# Altium footprint library General_Lib.PcbLib: 729 footprints (part 6 of 46)
Each footprint in its own frame and in the unit in brackets; x right, y up, seen from the top. Pads: shape width x height; smd on the part's side, far side on the other; paste and mask are expansions set on the pad; w line width, h text height; cw(c..) or ccw(c..) is an arc to the next point about the centre after c.
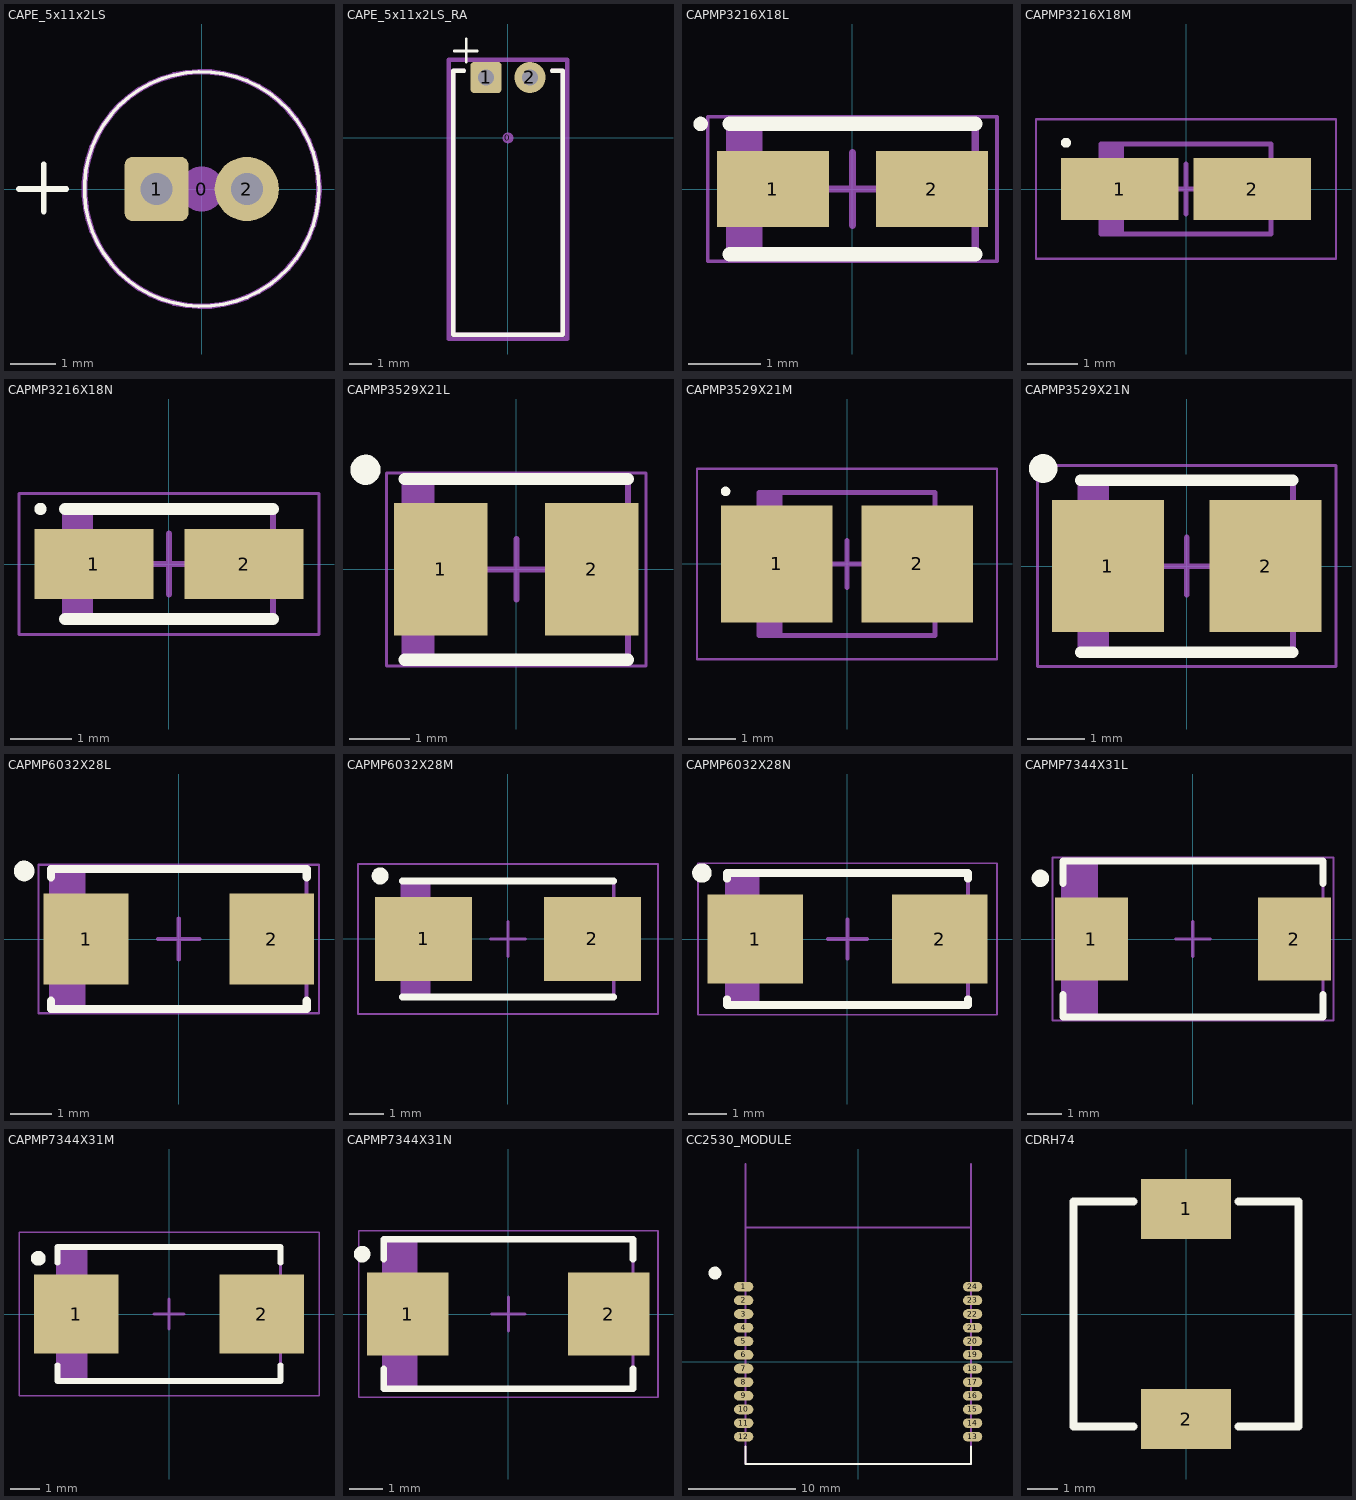
[diagram p5: the footprints below, top view; thin cyan lines are the x and y axes]

## CAPE_5x11x2LS [mil] "Capacitor, electrolytic, radial can"
height 433.07
pads (3):
  round 39.37 on Mech15: 0(0,0)
  rrect25% 56x56 hole 28: 1(-39.37,0)
  round 56 hole 28: 2(39.37,0)
Top Overlay:
  circle w3: c0,0 r102.36
  lines w5: -159.45,0 -118.11,0 ; -137.8,-19.68 -137.8,21.65
Mechanical 13:
  circle w5: c0,0 r102.36
3D body "Cap, elec, radial, 5x11x2LS.STEP": height 433.07, standoff -86.61, extent -98.42,-98.42 98.43,98.43

## CAPE_5x11x2LS_RA [mm] "Capacitor, electrolytic, radial can, laid over"
height 5
pads (3):
  round 0.5 on Mech15: 0(0,0)
  rrect25% 1.422x1.422 hole 0.711: 1(-1,2.75)
  round 1.422 hole 0.711: 2(1,2.75)
Top Overlay:
  lines w0.127: -2.45,3.95 -1.4,3.95 ; -1.9,3.45 -1.9,4.5
  lines w0.2: -2,3.05 -2.5,3.05 -2.5,-8.95 0,-8.95 2.5,-8.95 2.5,3.05 2,3.05
Mechanical 13:
  lines w0.2: -2,3.05 -2.5,3.05 -2.5,-8.95 0,-8.95 2.5,-8.95 2.5,3.05 2,3.05
Mechanical 15:
  lines w0.2: -2.7,-9.15 2.7,-9.15 2.7,3.55 -2.7,3.55 -2.7,-9.15
3D body "Cap, elec, radial, 5x11x2LS, RA.STEP": height 5.1, standoff -2.2, extent -2.5,-8.947 2.5,3

## CAPMP3216X18L [mm] "Molded Capacitor, 2-Leads, Body 3,20x1,60mm, IPC High Density"
height 1.8
pads (2):
  rect 1.55x1.05 smd: 1(-1.1,0) 2(1.1,0)
Top Overlay:
  circle w0.1: c-2.1,0.9 r0.05
  lines w0.2: -1.7,-0.9 1.7,-0.9 ; -1.7,0.9 1.7,0.9
Mechanical 13:
  rectangle: -1.7,-0.9 -1.243,0.9
  lines w0.1: -1.7,-0.9 -1.7,0.9 1.7,0.9 1.7,-0.9 -1.7,-0.9
Mechanical 15:
  lines w0.05: -2,-1 -2,1 2,1 2,-1 -2,-1
  lines w0.1: -0.5,0 0.5,0 ; 0,-0.5 0,0.5
3D body "CAPMP3216X18L.step": height 1.8, standoff 0, extent -1.92,-0.9 1.92,0.9

## CAPMP3216X18M [mm] "Molded Capacitor, 2-Leads, Body 3,20x1,60mm, IPC Low Density"
height 1.8
pads (2):
  rect 2.35x1.25 smd: 1(-1.325,0) 2(1.325,0)
Top Overlay:
  circle w0.1: c-2.4,0.925 r0.05
Mechanical 13:
  rectangle: -1.7,-0.9 -1.243,0.9
  lines w0.1: -1.7,-0.9 -1.7,0.9 1.7,0.9 1.7,-0.9 -1.7,-0.9
Mechanical 15:
  lines w0.05: -3,-1.4 -3,1.4 3,1.4 3,-1.4 -3,-1.4
  lines w0.1: -0.5,0 0.5,0 ; 0,-0.5 0,0.5
3D body "CAPMP3216X18M.step": height 1.8, standoff 0, extent -1.92,-0.9 1.92,0.9

## CAPMP3216X18N [mm] "Molded Capacitor, 2-Leads, Body 3,20x1,60mm, IPC Medium Density"
height 1.8
pads (2):
  rect 1.95x1.15 smd: 1(-1.225,0) 2(1.225,0)
Top Overlay:
  circle w0.1: c-2.1,0.9 r0.05
  lines w0.2: -1.7,-0.9 1.7,-0.9 ; -1.7,0.9 1.7,0.9
Mechanical 13:
  rectangle: -1.7,-0.9 -1.243,0.9
  lines w0.1: -1.7,-0.9 -1.7,0.9 1.7,0.9 1.7,-0.9 -1.7,-0.9
Mechanical 15:
  lines w0.05: -2.45,-1.15 -2.45,1.15 2.45,1.15 2.45,-1.15 -2.45,-1.15
  lines w0.1: -0.5,0 0.5,0 ; 0,-0.5 0,0.5
3D body "CAPMP3216X18N.step": height 1.8, standoff 0, extent -1.92,-0.9 1.92,0.9

## CAPMP3529X21L [mm] "Molded Capacitor, 2-Leads, Body 3,50x2,85mm, IPC High Density"
height 2.1
pads (2):
  rect 1.55x2.2 smd: 1(-1.25,0) 2(1.25,0)
Top Overlay:
  circle w0.25: c-2.5,1.65 r0.125
  lines w0.2: -1.85,-1.5 1.85,-1.5 ; -1.85,1.5 1.85,1.5
Mechanical 13:
  rectangle: -1.85,-1.5 -1.352,1.5
  lines w0.1: -1.85,-1.5 1.85,-1.5 1.85,1.5 -1.85,1.5 -1.85,-1.5
Mechanical 15:
  lines w0.05: -2.15,-1.6 2.15,-1.6 2.15,1.6 -2.15,1.6 -2.15,-1.6
  lines w0.1: -0.5,0 0.5,0 ; 0,-0.5 0,0.5
3D body "CAPMP3529X21L.step": height 2.1, standoff 0, extent -2.07,-1.5 2.07,1.5

## CAPMP3529X21M [mm] "Molded Capacitor, 2-Leads, Body 3,50x2,85mm, IPC Low Density"
height 2.1
pads (2):
  rect 2.35x2.45 smd: 1(-1.475,0) 2(1.475,0)
Top Overlay:
  circle w0.1: c-2.55,1.525 r0.05
Mechanical 13:
  rectangle: -1.85,-1.5 -1.352,1.5
  lines w0.1: -1.85,-1.5 -1.85,1.5 1.85,1.5 1.85,-1.5 -1.85,-1.5
Mechanical 15:
  lines w0.05: -3.15,-2 -3.15,2 3.15,2 3.15,-2 -3.15,-2
  lines w0.1: -0.5,0 0.5,0 ; 0,-0.5 0,0.5
3D body "CAPMP3529X21M.step": height 2.1, standoff 0, extent -2.07,-1.5 2.07,1.5

## CAPMP3529X21N [mm] "Molded Capacitor, 2-Leads, Body 3,50x2,85mm, IPC Medium Density"
height 2.1
pads (2):
  rect 1.95x2.3 smd: 1(-1.375,0) 2(1.375,0)
Top Overlay:
  circle w0.25: c-2.5,1.7 r0.125
  lines w0.2: -1.85,-1.5 1.85,-1.5 ; -1.85,1.5 1.85,1.5
Mechanical 13:
  rectangle: -1.85,-1.5 -1.352,1.5
  lines w0.1: -1.85,-1.5 -1.85,1.5 1.85,1.5 1.85,-1.5 -1.85,-1.5
Mechanical 15:
  lines w0.05: -2.6,-1.75 -2.6,1.75 2.6,1.75 2.6,-1.75 -2.6,-1.75
  lines w0.1: -0.5,0 0.5,0 ; 0,-0.5 0,0.5
3D body "CAPMP3529X21N.step": height 2.1, standoff 0, extent -2.07,-1.5 2.07,1.5

## CAPMP6032X28L [mm] "Molded Capacitor, 2-Leads, Body 6,00x3,25mm, IPC High Density"
height 2.8
pads (2):
  rect 2.05x2.2 smd: 1(-2.25,0) 2(2.25,0)
Top Overlay:
  circle w0.25: c-3.75,1.65 r0.125
  lines w0.2: -3.1,-1.5 -3.1,-1.7 3.1,-1.7 3.1,-1.5 ; -3.1,1.5 -3.1,1.7 3.1,1.7 3.1,1.5
Mechanical 13:
  rectangle: -3.1,-1.7 -2.266,1.7
  lines w0.1: -3.1,-1.7 3.1,-1.7 3.1,1.7 -3.1,1.7 -3.1,-1.7
Mechanical 15:
  lines w0.05: -3.4,-1.8 3.4,-1.8 3.4,1.8 -3.4,1.8 -3.4,-1.8
  lines w0.1: -0.5,0 0.5,0 ; 0,-0.5 0,0.5
3D body "CAPMP6032X28L.step": height 2.8, standoff 0, extent -3.32,-1.7 3.32,1.7

## CAPMP6032X28M [mm] "Molded Capacitor, 2-Leads, Body 6,00x3,25mm, IPC Low Density"
height 2.8
pads (2):
  rect 2.85x2.45 smd: 1(-2.475,0) 2(2.475,0)
Top Overlay:
  circle w0.25: c-3.75,1.85 r0.125
  lines w0.2: -3.1,-1.7 3.1,-1.7 ; -3.1,1.7 3.1,1.7
Mechanical 13:
  rectangle: -3.1,-1.7 -2.266,1.7
  lines w0.1: -3.1,-1.7 3.1,-1.7 3.1,1.7 -3.1,1.7 -3.1,-1.7
Mechanical 15:
  lines w0.05: -4.4,-2.2 4.4,-2.2 4.4,2.2 -4.4,2.2 -4.4,-2.2
  lines w0.1: -0.5,0 0.5,0 ; 0,-0.5 0,0.5
3D body "CAPMP6032X28M.step": height 2.8, standoff 0, extent -3.32,-1.7 3.32,1.7

## CAPMP6032X28N [mm] "Molded Capacitor, 2-Leads, Body 6,00x3,25mm, IPC Medium Density"
height 2.8
pads (2):
  rect 2.45x2.3 smd: 1(-2.375,0) 2(2.375,0)
Top Overlay:
  circle w0.25: c-3.75,1.7 r0.125
  lines w0.2: -3.1,-1.55 -3.1,-1.7 3.1,-1.7 3.1,-1.55 ; -3.1,1.55 -3.1,1.7 3.1,1.7 3.1,1.55
Mechanical 13:
  rectangle: -3.1,-1.7 -2.266,1.7
  lines w0.1: -3.1,-1.7 3.1,-1.7 3.1,1.7 -3.1,1.7 -3.1,-1.7
Mechanical 15:
  lines w0.05: -3.85,-1.95 3.85,-1.95 3.85,1.95 -3.85,1.95 -3.85,-1.95
  lines w0.1: -0.5,0 0.5,0 ; 0,-0.5 0,0.5
3D body "CAPMP6032X28N.step": height 2.8, standoff 0, extent -3.32,-1.7 3.32,1.7

## CAPMP7344X31L [mm] "Molded Capacitor, 2-Leads, Body 7,30x4,35mm, IPC High Density"
height 3.1
pads (2):
  rect 2.1x2.4 smd: 1(-2.925,0) 2(2.925,0)
Top Overlay:
  circle w0.25: c-4.4,1.75 r0.125
  lines w0.2: -3.75,-1.6 -3.75,-2.25 3.75,-2.25 3.75,-1.6 ; -3.75,1.6 -3.75,2.25 3.75,2.25 3.75,1.6
Mechanical 13:
  rectangle: -3.75,-2.25 -2.741,2.25
  lines w0.1: -3.75,-2.25 3.75,-2.25 3.75,2.25 -3.75,2.25 -3.75,-2.25
Mechanical 15:
  lines w0.05: -4.05,-2.35 4.05,-2.35 4.05,2.35 -4.05,2.35 -4.05,-2.35
  lines w0.1: -0.5,0 0.5,0 ; 0,-0.5 0,0.5
3D body "CAPMP7344X31L.step": height 3.1, standoff 0, extent -3.97,-2.25 3.97,2.25

## CAPMP7344X31M [mm] "Molded Capacitor, 2-Leads, Body 7,30x4,35mm, IPC Low Density"
height 3.1
pads (2):
  rect 2.85x2.65 smd: 1(-3.125,0) 2(3.125,0)
Top Overlay:
  circle w0.25: c-4.4,1.875 r0.125
  lines w0.2: -3.75,-1.725 -3.75,-2.25 3.75,-2.25 3.75,-1.725 ; -3.75,1.725 -3.75,2.25 3.75,2.25 3.75,1.725
Mechanical 13:
  rectangle: -3.75,-2.25 -2.741,2.25
  lines w0.1: -3.75,-2.25 3.75,-2.25 3.75,2.25 -3.75,2.25 -3.75,-2.25
Mechanical 15:
  lines w0.05: -5.05,-2.75 5.05,-2.75 5.05,2.75 -5.05,2.75 -5.05,-2.75
  lines w0.1: -0.5,0 0.5,0 ; 0,-0.5 0,0.5
3D body "CAPMP7344X31M.step": height 3.1, standoff 0, extent -3.97,-2.25 3.97,2.25

## CAPMP7344X31N [mm] "Molded Capacitor, 2-Leads, Body 7,30x4,35mm, IPC Medium Density"
height 3.1
pads (2):
  rect 2.45x2.5 smd: 1(-3.025,0) 2(3.025,0)
Top Overlay:
  circle w0.25: c-4.4,1.8 r0.125
  lines w0.2: -3.75,-1.65 -3.75,-2.25 3.75,-2.25 3.75,-1.65 ; -3.75,1.65 -3.75,2.25 3.75,2.25 3.75,1.65
Mechanical 13:
  rectangle: -3.75,-2.25 -2.741,2.25
  lines w0.1: -3.75,-2.25 3.75,-2.25 3.75,2.25 -3.75,2.25 -3.75,-2.25
Mechanical 15:
  lines w0.05: -4.5,-2.5 4.5,-2.5 4.5,2.5 -4.5,2.5 -4.5,-2.5
  lines w0.1: -0.5,0 0.5,0 ; 0,-0.5 0,0.5
3D body "CAPMP7344X31N.step": height 3.1, standoff 0, extent -3.97,-2.25 3.97,2.25

## CC2530_MODULE [mm] "SOIC, 24-Leads, Body 10.30x20.33mm, Pitch 1.27mm, IPC Medium Density"
height 2.65
pads (24):
  oval 1.8x0.9 smd: 1(-10.66,6.985) 2(-10.66,5.715) 3(-10.66,4.445) 4(-10.66,3.175) 5(-10.66,1.905) 6(-10.66,0.635) 7(-10.66,-0.635) 8(-10.66,-1.905) 9(-10.66,-3.175) 10(-10.66,-4.445) 11(-10.66,-5.715) 12(-10.66,-6.985) 13(10.66,-6.985) 14(10.66,-5.715) 15(10.66,-4.445) 16(10.66,-3.175) 17(10.66,-1.905) 18(10.66,-0.635) 19(10.66,0.635) 20(10.66,1.905) 21(10.66,3.175) 22(10.66,4.445) 23(10.66,5.715) 24(10.66,6.985)
Top Overlay:
  circle w0.6: c-13.335,8.255 r0.3
  lines w0.2: -10.5,-7.915 -10.5,-9.525 10.5,-9.525 10.5,-7.915
Mechanical 15:
  lines w0.2: -10.5,-9.525 -10.5,18.415 ; -10.5,12.5 10.5,12.5 ; 10.5,-9.525 10.5,18.415

## CDRH74 [mm]
height 5
pads (2):
  rect 3x2 smd: 1(0,3.5) 2(0,-3.5)
Top Overlay:
  lines w0.254: -1.75,-3.75 -3.75,-3.75 -3.75,3.75 -1.75,3.75 ; 1.75,-3.75 3.75,-3.75 3.75,3.75 1.75,3.75
3D body "CDRR75.step": height 4.5, standoff -0.03, extent -3.5,-3.525 3.5,3.525